# Altium footprint library TranDangKhoa-LIB.PcbLib: 1435 footprints (part 67 of 90)
Each footprint in its own frame and in the unit in brackets; x right, y up, seen from the top. Pads: shape width x height; smd on the part's side, far side on the other; paste and mask are expansions set on the pad; w line width, h text height; cw(c..) or ccw(c..) is an arc to the next point about the centre after c.
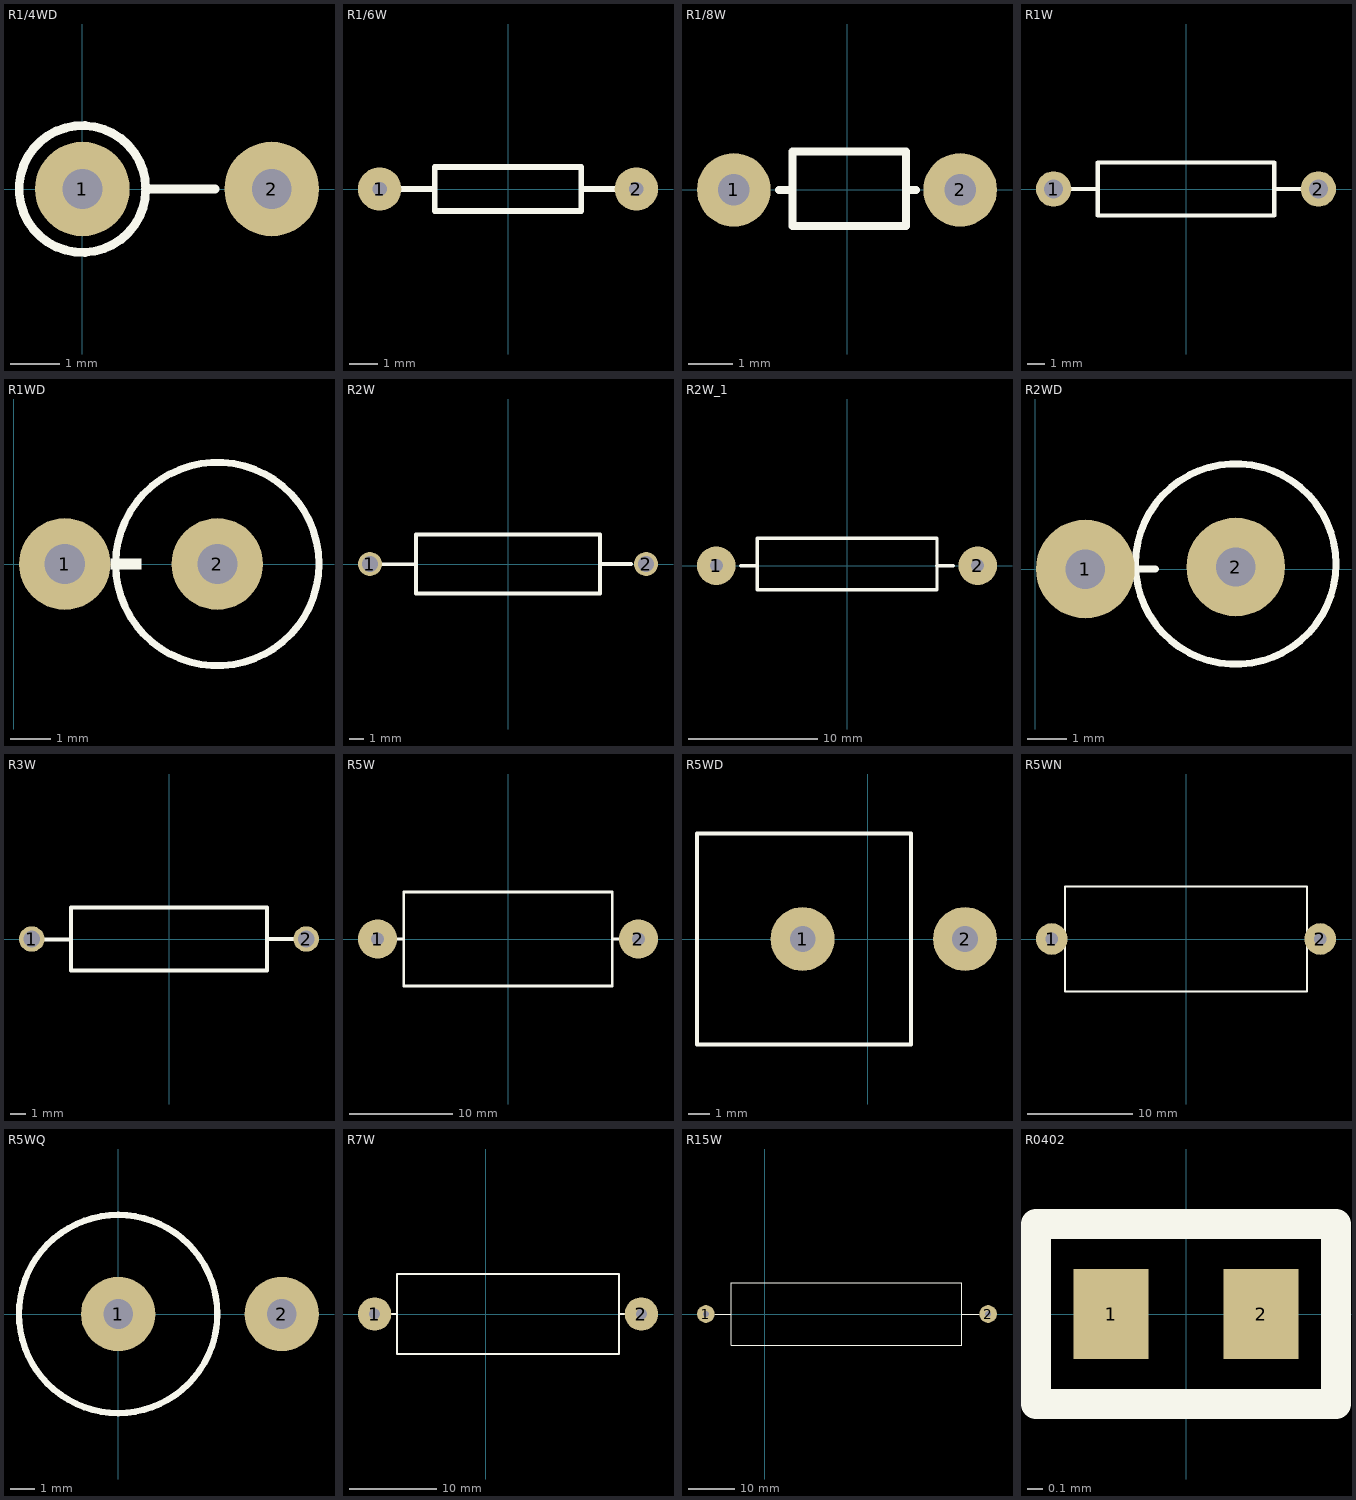
[diagram p66: the footprints below, top view; thin cyan lines are the x and y axes]

## R1/4WD [mm] "R 1/4W, 2 Pin, 150mil"
height 2.54
pads (2):
  round 1.905 hole 0.8: 1(0,0) 2(3.81,0)
Top Overlay:
  circle w0.178: c0,0 r1.276
  lines w0.178: 1.27,0 2.667,0
3D body "SW3DPS-0_5W METAL FILM RESISTOR-DEFAULT.STEP": height 13.42, standoff -4.28, extent -1.778,-1.7 4.322,1.7

## R1/6W [mm]
height 1.524
pads (2):
  round 1.5 hole 0.5: 1(-4.445,0) 2(4.445,0)
Top Overlay:
  lines w0.2: -3.81,0 -2.54,0 ; 3.81,0 2.54,0 ; 2.54,0 2.54,-0.762 -2.54,-0.762 -2.54,0.762 2.54,0.762 2.54,0

## R1/8W [mil] "R 1/8W, 2 pin, 300mil"
height 100
pads (2):
  round 65 hole 28: 1(-100,0) 2(100,0)
Top Overlay:
  lines w7: -60,0 -48,0 ; 54,0 61,0 ; -48,-32 52,-32 52,34 -48,34 -48,-32
3D body "SW3dPS-Res_Normal (0.25W).STEP": height 86.31, standoff -68.11, extent -135,-35.48 135,37

## R1W [mil] "dien tro 1W"
pads (2):
  round 80 hole 43.31: 1(-300,0) 2(300,0)
Top Overlay:
  lines w10: -300,0 -200,0 ; 200,0 300,0 ; -200,-60 -200,60 200,60 200,-60 -200,-60
3D body "User Library-Resistor Vishay AC051.STEP": height 283.46, standoff -132.33, extent -315.75,-86.61 315.75,86.61

## R1WD [mil] "R 1W, 2 pin, 500mil"
height 100
pads (2):
  round 90 hole 39.37: 1(50,0) 2(200,0)
Top Overlay:
  circle w7: c200,0 r100
  region: 125,5 125,-5 95,-5 95,5

## R2W [mil] "dien tro 2W"
height 10
pads (2):
  round 65 hole 43.31: 1(-375,0) 2(375,0)
Top Overlay:
  lines w10: -340,-1 -250,-1 -250,-80 250,-80 250,80 -250,80 -250,0 -251,-1 ; 250,0 335,0
3D body "User Library-Resistor Vishay AC052.STEP": height 307.09, standoff -132.33, extent -390.74,-110.23 390.76,110.24

## R2W_1 [mm]
pads (2):
  round 3 hole 1.016: 1(-10.16,0) 2(10.16,0)
Top Overlay:
  lines w0.25: -5.5,-1.873 6.985,-1.873 6.985,2.127 -5.5,2.127
  lines w0.254: -8.255,0 -6.985,0 ; -5.5,-1.873 -6.985,-1.873 -6.985,2.127 -5.5,2.127 ; 6.985,0 8.255,0
3D body "AXIAL08-3D.STEP": height 4.57, standoff -2.54, extent -10.414,-1.905 10.414,2.159

## R2WD [mm] "R2W, 2 pin, 700mil"
height 5.08
pads (2):
  round 2.5 hole 1: 1(1.27,0) 2(5.08,0.051)
Top Overlay:
  circle w0.178: c5.08,0.127 r2.54
  lines w0.178: 2.159,0 3.048,0
3D body "User Library-Res_Stand.STEP": height 16.25, standoff -2.71, extent 1.02,-2.936 8.015,2.942

## R3W [mil] "dien tro 3W"
pads (2):
  round 65 hole 43.31: 1(-350,0) 2(350,0)
Top Overlay:
  lines w10: -321,-1 -250,-1 -250,-80 250,-80 250,80 -250,80 -250,0 -251,-1 ; 250,0 320,0
3D body "User Library-Resistor Vishay AC05.STEP": height 314.96, standoff -132.33, extent -365.74,-118.1 365.75,118.11

## R5W [mm] "dien tro 5W"
pads (2):
  round 3.81 hole 1.27: 1(-12.7,0) 2(12.7,0)
Top Overlay:
  lines w0.254: -11.811,0 -10.16,0 ; 10.16,0 11.684,0 ; -10.16,-4.572 10.16,-4.572 10.16,4.572 -10.16,4.572 -10.16,-4.572
3D body "User Library-Resistor Vishay AC053.STEP": height 10, standoff -3.36, extent -13.1,-4.92 13.1,5.08

## R5WD [mm] "R5W , 2 pin, 300 x 600 mil"
height 10.16
pads (2):
  round 3 hole 1.2: 1(-3.048,0) 2(4.572,0)
Top Overlay:
  lines w0.178: -8.001,-4.953 -8.001,4.953 2.032,4.953 2.032,-4.953 -8.001,-4.953
3D body "SW3dPS-5W Res.STEP": height 23.05, standoff -2.4, extent -8.001,-5 5.079,5

## R5WN [mm]
pads (2):
  round 3 hole 1.2 paste-2539.97: 1(-12.75,0) 2(12.75,0)
Top Overlay:
  lines w0.2: -11.5,-5 11.5,-5 11.5,5 -11.5,5 -11.5,-5
3D body "AXIAL10-3D.STEP": height 8.89, standoff -2.54, extent -13.081,-5 13.081,5.16

## R5WQ [mm] "R5W , 2 pin, 300 x 600 mil"
height 10.16
pads (2):
  round 3 hole 1.2: 1(0,0) 2(6.604,0)
Top Overlay:
  circle w0.254: c0,0 r4
3D body "User Library-Resistor_PTH_AC05_Vishay_5W_Vertical.STEP": height 21.4, standoff -4.6, extent -3.75,-3.75 6.9,3.75

## R7W [mm] "dien tro 5W"
pads (2):
  round 3.81 hole 1.27: 1(-12.7,0) 2(17.78,0)
Top Overlay:
  lines w0.254: -11.811,0 -10.16,0 ; 15.24,0 17.78,0 ; -10.16,-4.572 -10.16,4.572 15.24,4.572 15.24,-4.572 -10.16,-4.572
3D body "SW3dPS-PRWC7W.STEP": height 10.51, standoff -2.36, extent -13.077,-4.5 18.154,4.5

## R15W [mm] "dien tro 5W"
pads (2):
  round 3.81 hole 1.27: 1(-12.7,0) 2(48.26,0)
Top Overlay:
  lines w0.254: -10.795,0 -7.239,0 ; 42.545,0 46.355,0 ; -7.239,-6.731 -7.239,6.731 42.545,6.731 42.545,-6.731 -7.239,-6.731
3D body "User Library-Resistor CR15.STEP": height 16.5, standoff -2.75, extent -13.081,-6.755 48.596,6.755

## R0402 [mm]
pads (2):
  rect 0.5x0.6 smd: 1(-0.5,0) 2(0.5,0)
Top Overlay:
  lines w0.2: -1,-0.6 -1,0.6 1,0.6 1,-0.6 -1,-0.6
Mechanical 16:
  lines w0.15: -1,-0.6 1,-0.6 1,0.6 -1,0.6 -1,-0.6
Mechanical 29:
  text ".Designator" at -0.7,-0.2 h0.4
3D body "R0402.step": height 0.4, standoff 0, extent -0.5,-0.25 0.5,0.25